# Altium footprint library FOC.PcbLib: 148 footprints (part 9 of 10)
Each footprint in its own frame and in the unit in brackets; x right, y up, seen from the top. Pads: shape width x height; smd on the part's side, far side on the other; paste and mask are expansions set on the pad; w line width, h text height; cw(c..) or ccw(c..) is an arc to the next point about the centre after c.
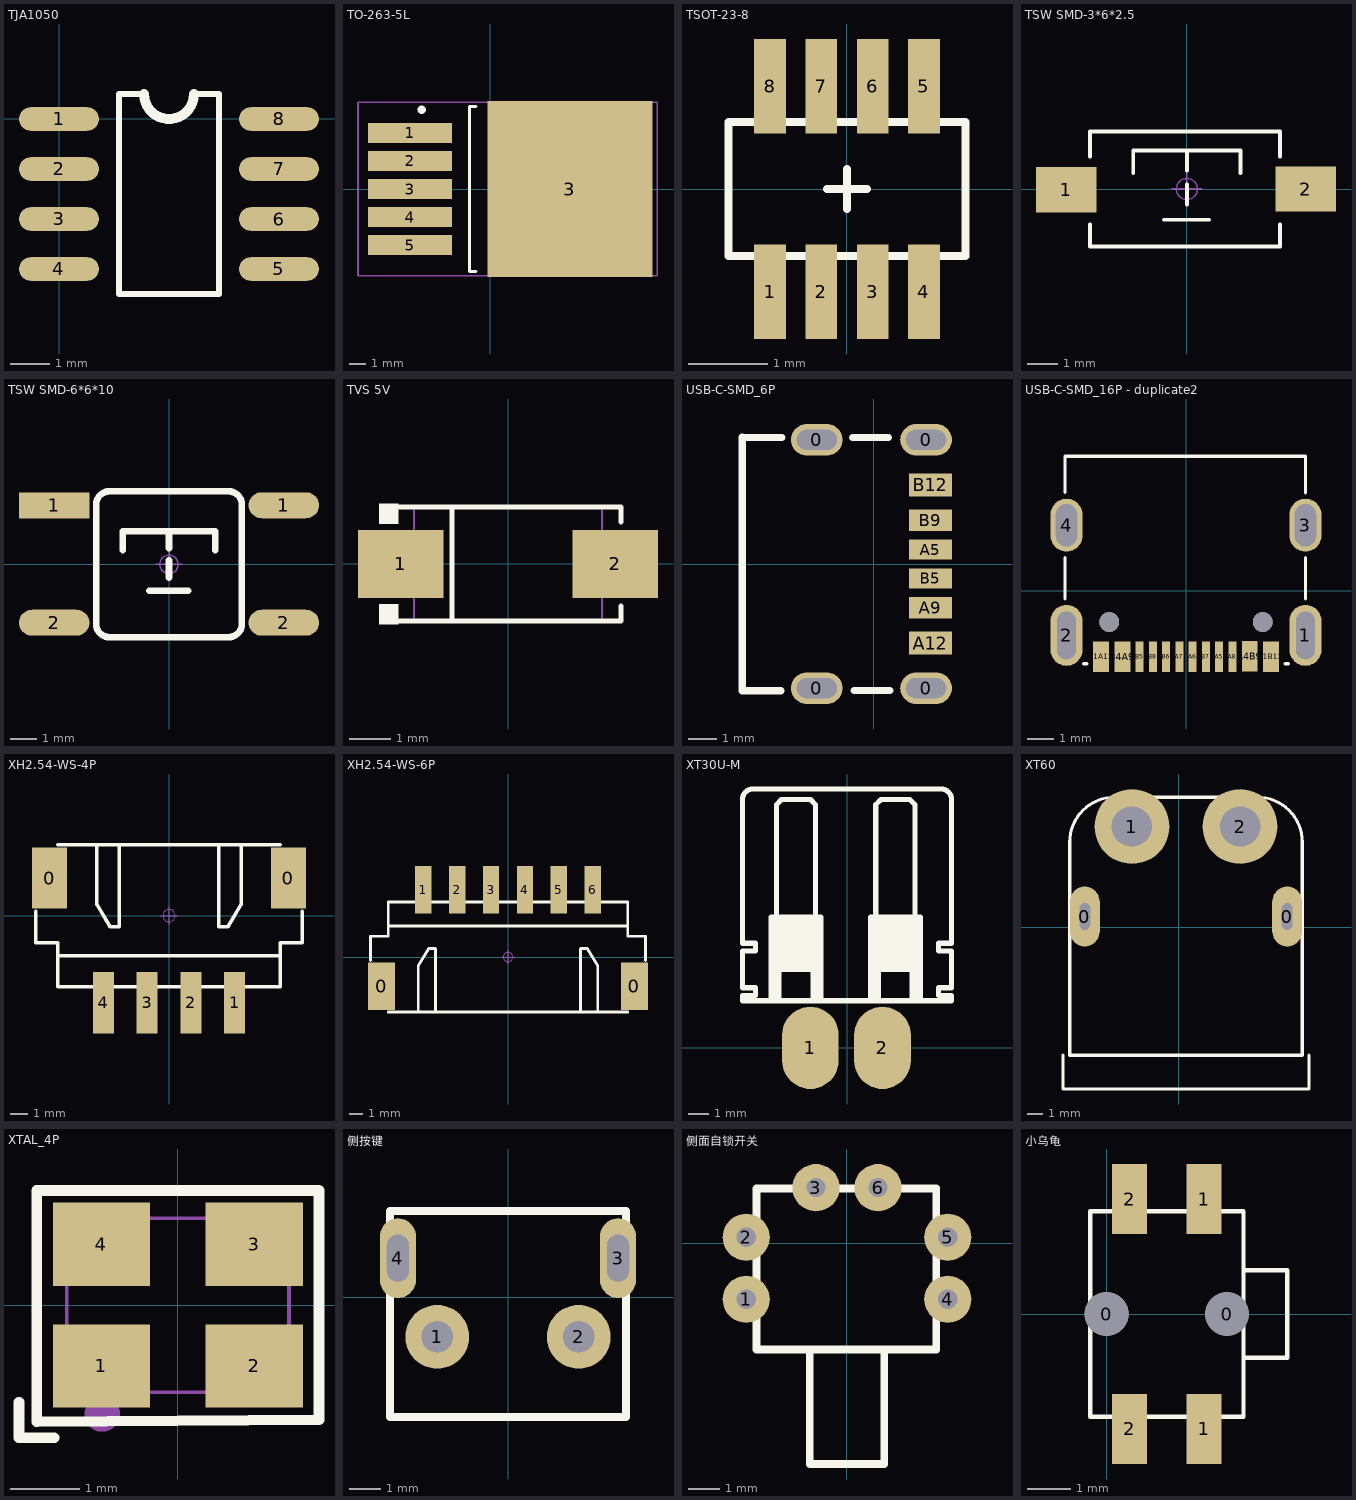
[diagram p8: the footprints below, top view; thin cyan lines are the x and y axes]

## TJA1050 [mil]
height 137.8
pads (8):
  oval 80x23.62 smd: 1(0,0) 2(0,-50) 3(0,-100) 4(0,-150) 5(220,-150) 6(220,-100) 7(220,-50) 8(220,0)
Top Overlay:
  lines w6: 85,25 60,25 60,-175 160,-175 160,25 135,25
  lines w10: 85,25 ccw(c110,25) 135,25
3D body "SO8.STEP": height 57, standoff 0, extent -2.75,-172.01 224.74,20.99

## TO-263-5L [mm]
pads (6):
  rect 5.08x1.2 smd: 1(-4.845,3.4) 2(-4.845,1.7) 3(-4.845,0) 4(-4.845,-1.7) 5(-4.845,-3.4)
  rect 10x10.66 smd: 3(4.845,0)
Top Overlay:
  circle w0.25: c-4.138,4.801 r0.125
  lines w0.2: -0.864,-5 -1.245,-5 -1.245,5 -0.864,5
Mechanical 15:
  lines w0.1: 0.155,0 1.155,0 ; 0.655,-0.5 0.655,0.5 ; -7.995,-5.25 -7.995,5.25 10.129,5.25 10.129,-5.25 -7.995,-5.25
3D body: height 4.58, standoff 0.02, extent -4.34,-5.055 9.674,5.105

## TSOT-23-8 [mm] "MP2236"
pads (8):
  rect 0.4x1.2 smd: 1(-0.975,-1.3) 2(-0.325,-1.3) 3(0.325,-1.3) 4(0.975,-1.3) 5(0.975,1.3) 6(0.325,1.3) 8(-0.975,1.3)
  rect 0.4x1.2 smd mask+0.102: 7(-0.325,1.3)
Top Overlay:
  lines w0.1: -0.254,0 0.254,0 ; 0,-0.254 0,0 0,0.254 ; -1.5,-0.85 -1.5,0.85 1.5,0.85 1.5,-0.85 -1.5,-0.85
3D body: height 1.5, standoff 0, extent -1.524,-0.889 1.524,0.889

## TSW SMD-3*6*2.5 [mm] "3*6*2.5mm"
pads (2):
  rect 2x1.5 smd: 1(-3.996,-0.02) 2(3.937,0)
Top Overlay:
  lines w0.127: -3.212,-1.168 -3.212,-1.9 3.088,-1.9 3.088,-1.168 ; -3.212,1.067 -3.212,1.9 3.088,1.9 3.088,1.067 ; -1.778,0.533 -1.778,1.27 1.778,1.27 1.778,0.533 ; -0.762,-1.016 0.737,-1.016 ; 0,-0.508 0,0.152 ; 0,0.61 0,1.27
Mechanical 15:
  circle w0.05: c0,0 r0.35
  lines w0.05: -0.5,0 0.5,0 ; 0,-0.5 0,0.5
3D body "TSW SMD-3x6x2.5.STEP": height 2.59, standoff -0.03, extent -4,-1.877 4,1.623

## TSW SMD-6*6*10 [mm] "6*6*10mm"
pads (4):
  rect 2.7x1 smd: 1(-4.4,2.261)
  oval 2.7x1 smd: 1(4.4,2.261) 2(-4.4,-2.239) 2(4.4,-2.239)
Top Overlay:
  lines w0.254: -1.778,0.533 -1.778,1.27 1.778,1.27 1.778,0.533 ; -0.762,-1.016 0.737,-1.016 ; 0,-0.508 0,0.152 ; 0,0.61 0,1.27 ; -2.794,-2.286 ccw(c-2.286,-2.286) -2.286,-2.794 2.286,-2.794 ccw(c2.286,-2.286) 2.794,-2.286 2.794,2.286 ccw(c2.286,2.286) 2.286,2.794 -2.286,2.794 ccw(c-2.286,2.286) -2.794,2.286 -2.794,-2.286
Mechanical 15:
  circle w0.05: c0,0 r0.35
  lines w0.05: -0.5,0 0.5,0 ; 0,-0.5 0,0.5
3D body "TSW SMD-6x6x10.STEP": height 9.95, standoff -0.03, extent -4.5,-3 4.5,3

## TVS 5V [mm]
pads (2):
  rect 2.046x1.62 smd mask+0.051: 1(-2.565,0) 2(2.565,0)
Top Overlay:
  region: -2.625,-1.44 -2.625,-0.962 -3.082,-0.962 -3.082,-1.44
  region: -2.625,1.44 -2.625,0.962 -3.082,0.962 -3.082,1.44
  lines w0.127: -2.701,-1.364 2.701,-1.364 2.701,-1.013 ; -2.701,1.364 2.701,1.364 2.701,1.013 ; -1.339,-1.364 -1.339,1.364
Mechanical 6:
  region: 2.142,-0.644 2.142,0.644 1.949,0.644 1.949,-0.644
  region: 2.432,-0.097 2.432,0.097 1.659,0.097 1.659,-0.097
  region: -2.432,-0.097 -2.432,0.097 -1.659,0.097 -1.659,-0.097
Mechanical 15:
  region: 2.809,0.725 2.809,-0.725 1.659,-0.725 1.659,0.725
  region: -2.8,-0.725 -2.8,0.725 -1.65,0.725 -1.65,-0.725
  region: -2.74,-1.375 -2.74,-1.35 -2.775,-1.315 -2.825,-1.315 -2.86,-1.35 -2.86,-1.375 -2.86,-1.4 -2.825,-1.435 -2.775,-1.435 -2.74,-1.4
  lines w0.051: -2.25,-1.375 2.25,-1.375 2.25,1.375 -2.25,1.375 -2.25,-1.375

## USB-C-SMD_6P [mil]
pads (10):
  oval 70.82x43.31 hole 27.56 slot 55.16 at 0 deg: 0(-77.75,-170.08) 0(-77.75,170.08) 0(71.84,-170.08) 0(71.84,170.08)
  rect 59x27.6 smd: A5(77.76,19.7) B5(77.76,-19.7)
  rect 59x29.9 smd: A9(77.76,-59.85) B9(77.76,59.85)
  rect 59x31.5 smd: A12(77.76,-108.25) B12(77.76,108.25)
Top Overlay:
  lines w10: -180.15,-173.6 -126.94,-173.6 ; -180.12,-173.62 -180.12,173.62 ; -180.12,173.23 -125.79,173.23 ; -28.54,173.23 20.27,173.23 ; -26.65,-173.23 22.16,-173.23
3D body "3D Model.STEP": height 126.77, standoff -37.01, extent -172.36,-175.99 95.35,175.98

## USB-C-SMD_16P - duplicate2 [mm]
pads (18):
  oval 1.2x2.3 hole 0.7 slot 1.8 at 90 deg: 1(4.5,-1.675) 2(-4.5,-1.675)
  oval 1.2x2 hole 0.8 slot 1.6 at 90 deg: 3(4.5,2.475) 4(-4.5,2.475)
  rect 0.6x1.15 smd: A1B12(3.2,-2.473) A4B9(2.4,-2.471) B1A12(-3.2,-2.475) B4A9(-2.4,-2.475)
  rect 0.3x1.15 smd: A5(1.25,-2.475) A6(0.25,-2.475) A7(-0.25,-2.473) B5(-1.75,-2.475) B6(-0.75,-2.475) B7(0.75,-2.473)
  rect 0.3x1.148 smd: A8(1.75,-2.475) B8(-1.25,-2.475)
  round 0.75 hole 0.75 unplated: ""(-2.89,-1.175) ""(2.89,-1.175)
Top Overlay:
  lines w0.127: -4.557,-0.296 -4.557,1.246 ; -4.557,3.704 -4.557,5.075 4.5,5.075 4.5,3.698 ; -3.856,-2.75 -3.819,-2.75 -3.731,-2.75 ; 3.731,-2.75 3.856,-2.75 ; 4.5,-0.302 4.5,1.252
3D body "3D Model.STEP": height 3.25, standoff -0.85, extent -4.445,-2.875 4.495,5.025

## XH2.54-WS-4P [mm] "长：15mm，宽：8mm，高：6.1mm"
pads (6):
  rect 2x3.5 smd: 0(-6.827,2.15) 0(6.827,2.15)
  rect 1.2x3.5 smd: 1(3.75,-4.981) 2(1.25,-4.981) 3(-1.25,-4.981) 4(-3.75,-4.981)
Top Overlay:
  lines w0.2: -7.62,0.254 -7.62,-1.536 -6.35,-1.536 -6.35,-4.064 6.35,-4.064 6.35,-1.536 7.62,-1.536 7.62,0.254 ; -6.35,-2.286 6.35,-2.286 ; -6.35,4.064 6.35,4.064 ; -4.12,4.064 -4.12,0.634 -3.358,-0.636 -2.85,-0.636 -2.85,4.064 ; 2.85,4.064 2.85,-0.636 3.358,-0.636 4.12,0.634 4.12,4.064
Mechanical 15:
  circle w0.05: c0,0 r0.35
  lines w0.05: -0.5,0 0.5,0 ; 0,-0.5 0,0.5
3D body "XH2.54-WS-4P.STEP": height 6.05, standoff -0.01, extent -7.5,-6.418 7.5,4

## XH2.54-WS-6P [mm] "长：20mm，宽：8mm，高：6.1mm"
pads (8):
  rect 2x3.5 smd: 0(-9.327,-2.15) 0(9.327,-2.15)
  rect 1.2x3.5 smd: 1(-6.25,4.981) 2(-3.75,4.981) 3(-1.25,4.981) 4(1.25,4.981) 5(3.75,4.981) 6(6.25,4.981)
Top Overlay:
  lines w0.2: -10.16,-0.254 -10.16,1.536 -8.85,1.536 -8.85,4.064 8.85,4.064 8.85,1.536 10.16,1.536 10.16,-0.254 ; -8.85,-4.064 8.85,-4.064 ; -8.85,2.286 8.85,2.286 ; -6.62,-4.064 -6.62,-0.634 -5.858,0.636 -5.35,0.636 -5.35,-4.064 ; 5.35,-4.064 5.35,0.636 5.858,0.636 6.62,-0.634 6.62,-4.064
Mechanical 15:
  circle w0.05: c0,0 r0.35
  lines w0.05: -0.5,0 0.5,0 ; 0,-0.5 0,0.5
3D body "XH2.54-WS-6P.STEP": height 6.05, standoff -0.01, extent -10,-4 10,6.418

## XT30U-M [mm]
pads (2):
  oval 2.75x4 smd: 1(-1.778,0) 2(1.722,0)
Top Overlay:
  region: 1.143,2.286 1.524,2.286 1.524,3.81 3.175,3.81 3.175,2.286 3.556,2.286 3.556,6.35 1.27,6.35 1.143,6.35
  region: -3.683,2.286 -3.302,2.286 -3.302,3.81 -1.651,3.81 -1.651,2.286 -1.27,2.286 -1.27,6.35 -3.556,6.35 -3.683,6.35
  lines w0.254: -3.683,2.286 -3.683,6.35 -3.429,6.35 ; -3.302,2.286 -3.302,3.81 -1.651,3.81 -1.651,2.286 ; -1.27,2.286 -1.27,6.35 -1.524,6.35 ; 1.143,2.286 1.143,6.35 1.397,6.35 ; 1.524,2.286 1.524,3.81 3.175,3.81 3.175,2.286 ; 3.556,2.286 3.556,6.35 3.302,6.35 ; -3.429,6.35 -1.524,6.35 ; -3.429,6.35 -3.429,11.811 -3.175,12.065 -2.667,12.065 -1.778,12.065 -1.524,11.811 -1.524,6.35 ; 1.397,6.35 3.302,6.35 ; 1.397,6.35 1.397,11.811 1.651,12.065 2.159,12.065 3.048,12.065 3.302,11.811 3.302,6.35 ; -5.08,2.286 0,2.286 5.08,2.286 5.08,2.54 4.445,2.54 4.445,2.921 4.953,2.921 5.08,2.921 5.08,3.048 5.08,4.699 4.445,4.699 4.445,5.08 5.08,5.08 5.08,12.065 ccw(c4.572,12.065) 4.572,12.573 0,12.573 -4.572,12.573 ccw(c-4.572,12.065) -5.08,12.065 -5.08,5.08 -4.445,5.08 -4.445,4.699 -5.08,4.699 -5.08,3.048 -5.08,2.921 -4.953,2.921 -4.445,2.921 -4.445,2.54 -5.08,2.54 -5.08,2.286

## XT60 [mm]
pads (4):
  oval 2x4 hole 0.7 slot 1.8 at 90 deg: 0(-6.267,0.706) 0(7.233,0.706)
  round 5 hole 2.7: 1(-3.117,6.706) 2(4.083,6.706)
Top Overlay:
  lines w0.203: -7.717,-8.544 -7.717,-10.794 8.683,-10.794 8.683,-8.544 ; -7.267,-8.544 -7.267,5.656 cw(c-4.267,5.656) -4.267,8.656 5.233,8.656 cw(c5.233,5.656) 8.233,5.656 8.233,-8.544 -7.267,-8.544

## XTAL_4P [mm]
pads (4):
  rect 1.4x1.2 smd: 1(-1.1,-0.875) 2(1.1,-0.875) 3(1.1,0.875) 4(-1.1,0.875)
Top Overlay:
  lines w0.152: -2.286,-1.397 -2.286,-1.905 -1.778,-1.905 ; -2.029,-1.679 -2.029,1.651 2.032,1.651 2.032,0 2.032,-1.651 -2.029,-1.679
Mechanical 6:
  circle w0.254: c-1.088,-1.567 r0.127
  region: -1.486,-0.428 -1.45,-0.428 -1.45,-1.004 -1.486,-1.004
  region: -1.522,-0.428 -1.486,-0.428 -1.486,-1.004 -1.522,-1.004
  region: -1.558,-0.428 -1.522,-0.428 -1.522,-1.004 -1.558,-1.004
  region: -1.594,-0.464 -1.558,-0.464 -1.558,-1.004 -1.594,-1.004
  region: -1.63,-0.464 -1.594,-0.464 -1.594,-0.572 -1.63,-0.572
  region: -1.666,-0.5 -1.63,-0.5 -1.63,-0.608 -1.666,-0.608
  region: -1.702,-0.536 -1.666,-0.536 -1.666,-0.608 -1.702,-0.608
  region: -1.738,-0.536 -1.702,-0.536 -1.702,-0.608 -1.738,-0.608
Mechanical 15:
  region: -1.54,-1.25 -1.54,-1.225 -1.575,-1.191 -1.624,-1.191 -1.659,-1.225 -1.66,-1.25 -1.659,-1.274 -1.624,-1.309 -1.576,-1.309 -1.541,-1.274
  region: 0.6,1.249 1.5,1.249 1.5,0.449 0.6,0.449
  region: -1.5,1.249 -0.6,1.249 -0.6,0.449 -1.5,0.449
  region: -1.5,-0.449 -0.6,-0.449 -0.6,-1.249 -1.5,-1.249
  region: 0.6,-0.449 1.5,-0.449 1.5,-1.249 0.6,-1.249
  lines w0.051: -1.6,-1.25 -1.6,1.25 1.6,1.25 1.6,-1.25 -1.6,-1.25
3D body "SMD3225-4P.STEP": height 0.8, standoff -0.01, extent -1.6,-1.25 1.6,1.25

## 侧按键 [mm]
pads (4):
  round 2.032 hole 1: 1(-2.25,-1.25) 2(2.25,-1.25)
  oval 1.143x2.54 hole 1.5 slot 0.7 at 0 deg: 3(3.5,1.25) 4(-3.5,1.25)
Top Overlay:
  lines w0.254: -3.75,-3.8 3.75,-3.8 3.75,2.75 -3.75,2.75 -3.75,-3.8

## 侧面自锁开关 [mm]
pads (6):
  round 1.524 hole 0.62: 1(-3.25,-1.8) 2(-3.25,0.2) 3(-1,1.8) 4(3.25,-1.8) 5(3.25,0.2) 6(1,1.8)
Top Overlay:
  lines w0.254: -1.2,-3.512 -1.2,-7.112 1.2,-7.112 1.2,-3.429 ; -2.921,-3.422 -2.921,1.778 2.879,1.778 2.879,-3.422 -2.921,-3.422

## 小乌龟 [mm]
pads (6):
  round 1 hole 1: 0(0,0)
  round 0.9 hole 1: 0(2.75,0)
  rect 0.8x1.6 smd: 1(2.225,-2.625) 1(2.225,2.625) 2(0.525,-2.625) 2(0.525,2.625)
Top Overlay:
  lines w0.1: 3.125,-1 4.125,-1 4.125,1 3.125,1 ; -0.375,-2.35 -0.375,2.35 3.125,2.35 3.125,-2.35 -0.375,-2.35